# Altium footprint library deep_lib.PcbLib: 35 footprints (part 1 of 3)
Each footprint in its own frame and in the unit in brackets; x right, y up, seen from the top. Pads: shape width x height; smd on the part's side, far side on the other; paste and mask are expansions set on the pad; w line width, h text height; cw(c..) or ccw(c..) is an arc to the next point about the centre after c.
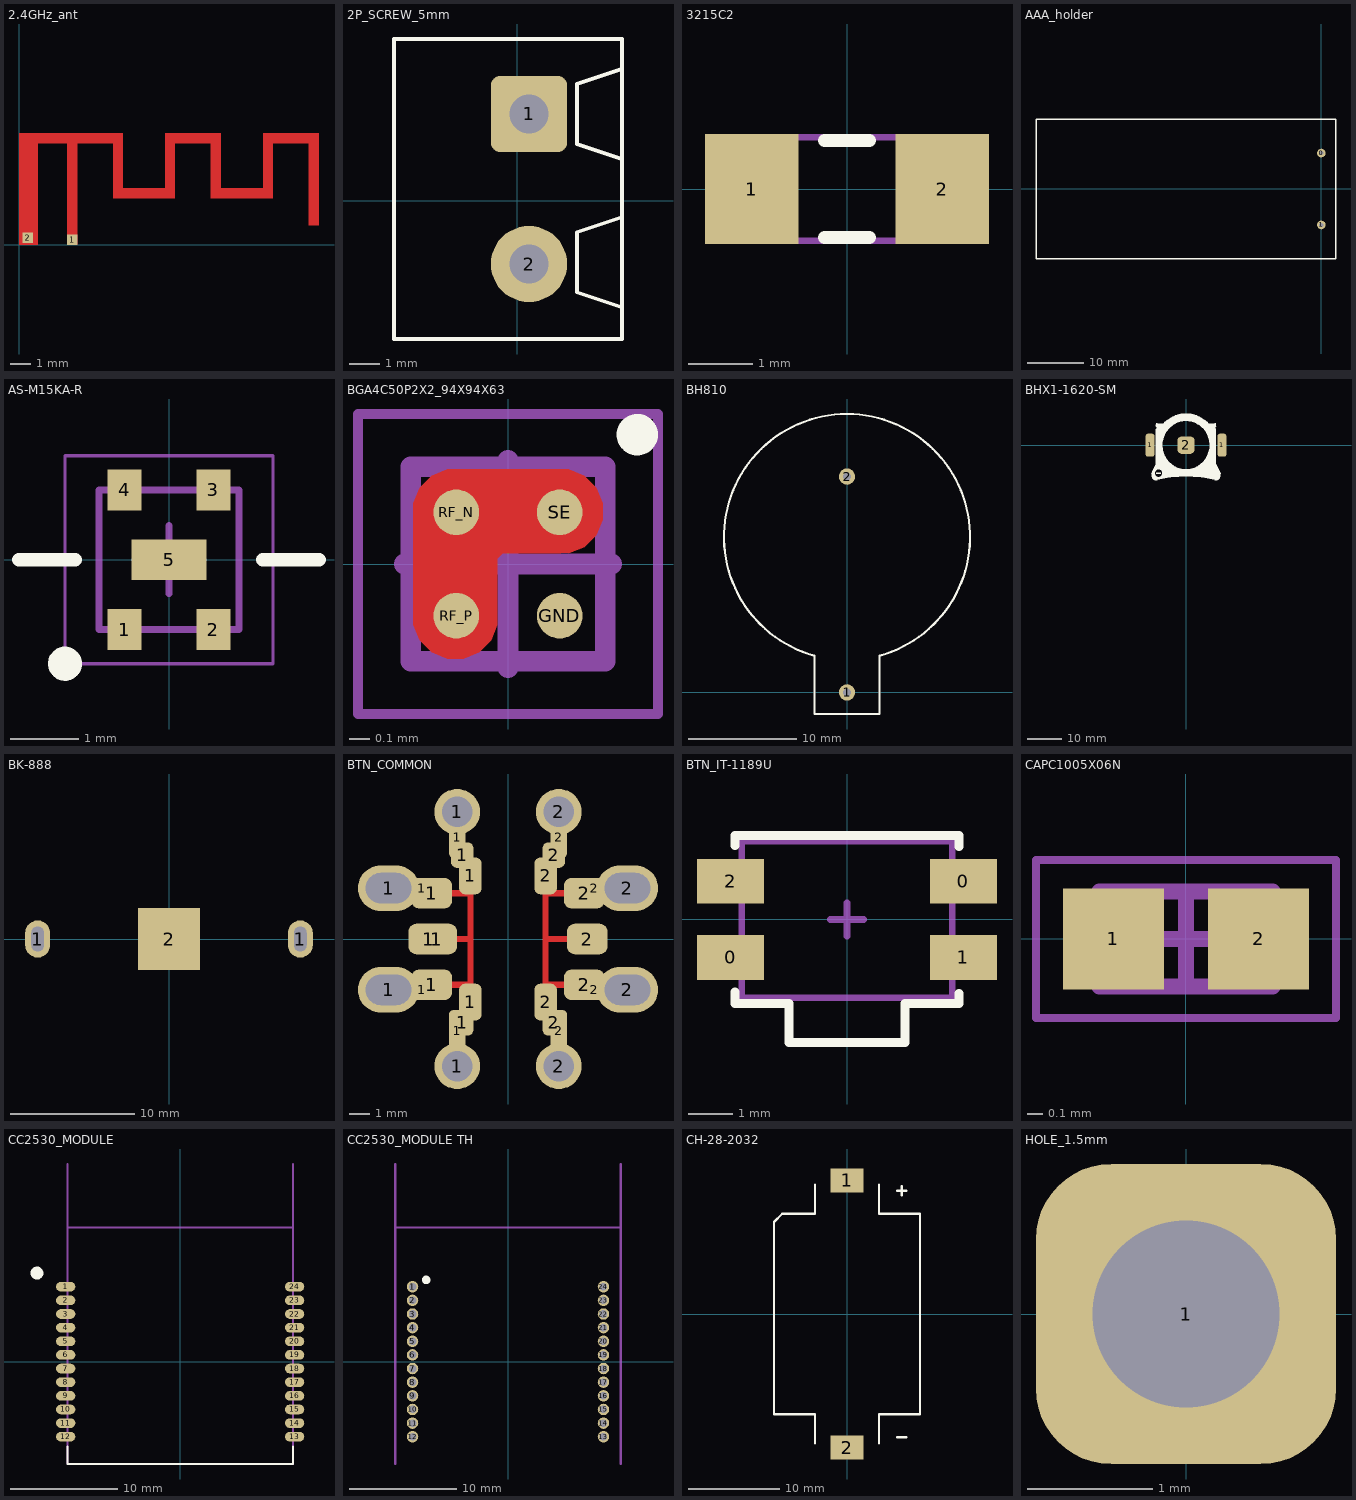
[diagram p0: the footprints below, top view; thin cyan lines are the x and y axes]

## 2.4GHz_ant [mm]
pads (2):
  rect 0.5x0.5 smd paste+0 mask+0: 1(2.55,0.25) 2(0.425,0.35)
Top Layer:
  rectangle: -0.001,4.882 5.001,5.382
  rectangle: 2.301,-0.008 2.801,5.382
  rectangle: 13.901,0.942 14.401,5.382
  rectangle: -0.001,-0.008 0.901,5.382
  rectangle: 7,2.243 7.5,5.382
  rectangle: 11.701,4.882 14.401,5.382
  rectangle: 11.701,2.243 12.199,5.382
  rectangle: 9.199,2.243 12.199,2.743
  rectangle: 4.5,2.243 5.001,5.382
  rectangle: 4.5,2.243 7.5,2.743
  rectangle: 7,4.882 9.7,5.382
  rectangle: 9.199,2.243 9.7,5.382

## 2P_SCREW_5mm [mm]
height 6
pads (2):
  rrect25% 2.54x2.54 hole 1.3: 1(0.4,2.9)
  round 2.54 hole 1.3: 2(0.4,-2.1)
Top Overlay:
  lines w0.127: 3.496,-3.539 1.996,-3.039 1.996,-1.039 3.496,-0.539 ; 3.496,1.401 1.996,1.901 1.996,3.901 3.496,4.401 ; -4.1,-4.6 3.5,-4.6 3.5,5.4 -4.1,5.4 -4.1,-4.6
3D body "301-021-12.STEP": height 10, standoff -4.5, extent -4.1,-4.6 3.5,5.4

## 3215C2 [mm] "Quartz resonator, 2-Leads, Body 3,20x1,50mm, IPC Low Density"
height 0.85
pads (2):
  rect 1.45x1.7 smd: 1(-1.475,0) 2(1.475,0)
Top Overlay:
  lines w0.2: -0.35,-0.75 0.35,-0.75 ; -0.35,0.75 0.35,0.75
Mechanical 13:
  lines w0.1: -1.65,-0.8 1.65,-0.8 1.65,0.8 -1.65,0.8 -1.65,-0.8
3D body: height 0.85, standoff 0, extent 0.9,-0.8 1.65,0.8
3D body: height 0.85, standoff 0, extent -1.65,-0.8 -0.9,0.8
3D body: height 0.85, standoff 0, extent -0.9,-0.8 0.9,0.8

## AAA_holder [mil]
pads (2):
  round 60 hole 30: 0(0,250) 1(0,-250)
Top Overlay:
  lines w10: -1984.25,-484.25 102.36,-484.25 102.36,484.25 -1984.25,484.25 -1984.25,-484.25

## AS-M15KA-R [mm]
height 1
pads (5):
  rect 0.5x0.6 smd: 1(-0.65,-1.025) 2(0.65,-1.025) 3(0.65,1.025) 4(-0.65,1.025)
  rect 1.1x0.6 smd: 5(0,0)
Top Overlay:
  circle w0.25: c-1.525,-1.525 r0.125
  lines w0.2: -2.2,0 -1.375,0 ; 1.375,0 2.2,0
Mechanical 13:
  lines w0.1: -1.025,-1.025 -1.025,1.025 1.025,1.025 1.025,-1.025 -1.025,-1.025
Mechanical 15:
  lines w0.05: -1.525,-1.525 -1.525,1.525 1.525,1.525 1.525,-1.525 -1.525,-1.525
  lines w0.1: -0.5,0 0.5,0 ; 0,-0.5 0,0.5
3D body: height 1, standoff 0.02, extent -1.025,-1.025 1.025,1.025

## BGA4C50P2X2_94X94X63 [mm] "BGA, 4-Leads, Body 0.94x0.94mmx0.63mm, Pitch 0.50mm"
height 0.63
pads (4):
  round 0.22 smd mask+0.1: GND(0.25,-0.25) RF_N(-0.25,0.25) RF_P(-0.25,-0.25) SE(0.25,0.25)
Top Layer:
  pour cut-out: -0.254,-0.457 -0.294,-0.457 -0.369,-0.426 -0.426,-0.369 -0.457,-0.294 -0.457,-0.254 -0.457,0.254 -0.457,0.294 -0.426,0.369 -0.369,0.426 -0.294,0.457 -0.254,0.457 0.254,0.457 0.294,0.457 0.369,0.426 0.426,0.369 0.457,0.294 0.457,0.254 0.457,0.214 0.426,0.139 0.369,0.082 0.294,0.051 0.254,0.051 -0.025,0.051 -0.051,0.025 -0.051,-0.254 -0.051,-0.294 -0.082,-0.369 -0.139,-0.426 -0.214,-0.457
Top Overlay:
  circle w0.1: c0.625,0.625 r0.05
Mechanical 13:
  lines w0.1: -0.47,-0.47 0.47,-0.47 0.47,0.47 -0.47,0.47 -0.47,-0.47
Mechanical 15:
  lines w0.05: -0.725,-0.725 0.725,-0.725 0.725,0.725 -0.725,0.725 -0.725,-0.725
  lines w0.1: -0.5,0 0.5,0 ; 0,-0.5 0,0.5
3D body: height 0.63, standoff 0.3, extent -0.47,-0.47 0.47,0.47

## BH810 [mil]
height 259.84
pads (2):
  round 60 hole 30: 1(0,0) 2(0,787.4)
Top Overlay:
  lines w7.87: -118.11,133.86 -118.11,-78.74 ; -118.09,133.92 cw(c0,566.93) 118.09,133.92 ; -114.17,-78.74 -118.11,-78.74 ; 114.17,-78.74 118.11,-78.74 ; 118.11,133.86 118.11,-78.74 ; -118.11,-78.74 118.11,-78.74

## BHX1-1620-SM [mm]
height 3.6
pads (3):
  rrect50% 2.5x6.6 smd: 1(-10.4,0) 1(10.4,0)
  rrect50% 5x5 smd: 2(0,0)
Top Overlay:
  drawing of 28 lines, arcs and shapes, not listed
3D body "User Library-keystone-PN3016.step": height 3.95, standoff -0.01, extent -11.597,-6.339 11.619,8.739

## BK-888 [mm]
pads (3):
  oval 2x3 hole 1 slot 2 at 90 deg: 1(-10.55,0) 1(10.55,0)
  rect 5x5 smd: 2(0,0)
3D body "BK-888.STEP": height 3.96, standoff -3.03, extent -10.541,-10.274 10.541,9.779

## BTN_COMMON [mm]
height 5
pads (31):
  oval 3x2.25 hole 1.5 slot 2.25 at 0 deg: 1(-5.875,-2.5) 1(-5.875,2.5) 2(5.875,-2.5) 2(5.875,2.5)
  rrect50% 1.5x0.8 smd: 1(-4.24,-2.5) 1(-4.24,2.5) 2(4.24,-2.5) 2(4.24,2.5)
  rrect50% 2x1.5 smd: 1(-3.9,0) 1(-3.75,-2.25) 1(-3.75,2.25) 1(-3.5,0) 2(3.75,-2.25) 2(3.75,2.25) 2(3.9,0)
  round 2.25 hole 1.5: 1(-2.5,-6.25) 1(-2.5,6.25) 2(2.5,-6.25) 2(2.5,6.25)
  rrect50% 0.8x2 smd: 1(-2.5,-4.5) 1(-2.5,5) 2(2.5,-4.5) 2(2.5,5)
  rrect50% 1.1x1.25 smd: 1(-2.25,-4.125) 1(-2.25,4.125) 2(2.25,-4.125) 2(2.25,4.125)
  rrect50% 1.1x1.8 smd: 1(-1.85,-3.1) 1(-1.85,3.1) 2(1.85,-3.1) 2(1.85,3.1)
Top Layer:
  lines w0.2: -1.85,-3.1 -1.85,-2.25 ; -1.85,2.25 -1.85,3.1
  lines w0.3: -3.75,-2.25 -1.85,-2.25 ; -3.75,2.25 -1.85,2.25 ; -3.5,0 -1.85,0 ; -1.85,-3.1 -1.85,3.1 ; 1.85,-3.1 1.85,3.1 ; 1.85,-2.25 3.75,-2.25 ; 1.85,0 3.5,0 ; 1.85,2.25 3.75,2.25

## BTN_IT-1189U [mm]
height 1.6
pads (4):
  rect 1.5x1 smd: 0(-2.6,-0.85) 0(2.6,0.85) 1(2.6,-0.85) 2(-2.6,0.85)
Top Overlay:
  lines w0.2: -2.5,-1.625 -2.5,-1.875 -1.3,-1.875 -1.3,-2.75 1.3,-2.75 1.3,-1.875 2.5,-1.875 2.5,-1.65 ; -2.5,1.65 -2.5,1.875 2.5,1.875 2.5,1.625
Mechanical 15:
  lines w0.15: -0.375,0 0.375,0 ; 0,-0.375 0,0.375 ; -2.35,-1.75 2.35,-1.75 2.35,1.75 -2.35,1.75 -2.35,-1.75

## CAPC1005X06N [mm] "Chip Capacitor, 2-Leads, Body 1,00x0,50mm, IPC Medium Density"
height 0.6
pads (2):
  rect 0.64x0.64 smd: 1(-0.46,0) 2(0.46,0)
Mechanical 13:
  lines w0.1: -0.55,-0.3 -0.55,0.3 0.55,0.3 0.55,-0.3 -0.55,-0.3
Mechanical 15:
  lines w0.05: -0.95,-0.5 -0.95,0.5 0.95,0.5 0.95,-0.5 -0.95,-0.5
  lines w0.1: -0.3,0 0.3,0 ; 0,-0.3 0,0.3
3D body: height 0.6, standoff 0, extent -0.35,-0.3 0.35,0.3
3D body: height 0.6, standoff 0, extent -0.55,-0.3 -0.35,0.3
3D body: height 0.6, standoff 0, extent 0.35,-0.3 0.55,0.3

## CC2530_MODULE [mm] "SOIC, 24-Leads, Body 10.30x20.33mm, Pitch 1.27mm, IPC Medium Density"
height 2.65
pads (24):
  oval 1.8x0.9 smd: 1(-10.66,6.985) 2(-10.66,5.715) 3(-10.66,4.445) 4(-10.66,3.175) 5(-10.66,1.905) 6(-10.66,0.635) 7(-10.66,-0.635) 8(-10.66,-1.905) 9(-10.66,-3.175) 10(-10.66,-4.445) 11(-10.66,-5.715) 12(-10.66,-6.985) 13(10.66,-6.985) 14(10.66,-5.715) 15(10.66,-4.445) 16(10.66,-3.175) 17(10.66,-1.905) 18(10.66,-0.635) 19(10.66,0.635) 20(10.66,1.905) 21(10.66,3.175) 22(10.66,4.445) 23(10.66,5.715) 24(10.66,6.985)
Top Overlay:
  circle w0.6: c-13.335,8.255 r0.3
  lines w0.2: -10.5,-7.915 -10.5,-9.525 10.5,-9.525 10.5,-7.915
Mechanical 15:
  lines w0.2: -10.5,-9.525 -10.5,18.415 ; -10.5,12.5 10.5,12.5 ; 10.5,-9.525 10.5,18.415

## CC2530_MODULE TH [mm] "SOIC, 24-Leads, Body 10.30x20.33mm, Pitch 1.27mm, IPC Medium Density"
height 2.65
pads (24):
  round 1.07 hole 0.7: 1(-8.89,6.985) 2(-8.89,5.715) 3(-8.89,4.445) 4(-8.89,3.175) 5(-8.89,1.905) 6(-8.89,0.635) 7(-8.89,-0.635) 8(-8.89,-1.905) 9(-8.89,-3.175) 10(-8.89,-4.445) 11(-8.89,-5.715) 12(-8.89,-6.985) 13(8.89,-6.985) 14(8.89,-5.715) 15(8.89,-4.445) 16(8.89,-3.175) 17(8.89,-1.905) 18(8.89,-0.635) 19(8.89,0.635) 20(8.89,1.905) 21(8.89,3.175) 22(8.89,4.445) 23(8.89,5.715) 24(8.89,6.985)
Top Overlay:
  circle w0.4: c-7.62,7.62 r0.2
Mechanical 15:
  lines w0.2: -10.5,-9.525 -10.5,18.415 ; -10.5,12.5 10.5,12.5 ; 10.5,-9.525 10.5,18.415
3D body "User Library-HDRV20W46P127_1X20_2540X250X880.STEP": height 6.5, standoff -2.3, extent -10.12,-7.62 -7.62,7.62
3D body "User Library-HDRV20W46P127_1X20_2540X250X880.STEP": height 6.5, standoff -2.3, extent 7.62,-7.62 10.12,7.62

## CH-28-2032 [mm]
pads (2):
  rect 3.6x2.6 smd: 1(0,14.65) 2(0,-14.65)
Top Overlay:
  lines w0.254: -3.5,-14.2 -3.5,-11 -8,-11 -8,10.1 -7.1,11 -3.5,11 -3.5,14.2 ; 3.5,-14.2 3.5,-11 8,-11 8,11 3.5,11 3.5,14.2 ; 5.5,-13.5 6.5,-13.5 ; 5.5,13.5 6.5,13.5 ; 6,13 6,14
3D body "User Library-CR2032_Holder.STEP": height 5.6, standoff 0, extent -8,-16.1 8,16.1

## HOLE_1.5mm [mm]
pads (1):
  rrect50% 2.4x2.4 hole 1.5: 1(0,0)